# Altium footprint library TomvanRijn-PCB.PcbLib: 165 footprints (part 11 of 11)
Each footprint in its own frame and in the unit in brackets; x right, y up, seen from the top. Pads: shape width x height; smd on the part's side, far side on the other; paste and mask are expansions set on the pad; w line width, h text height; cw(c..) or ccw(c..) is an arc to the next point about the centre after c.
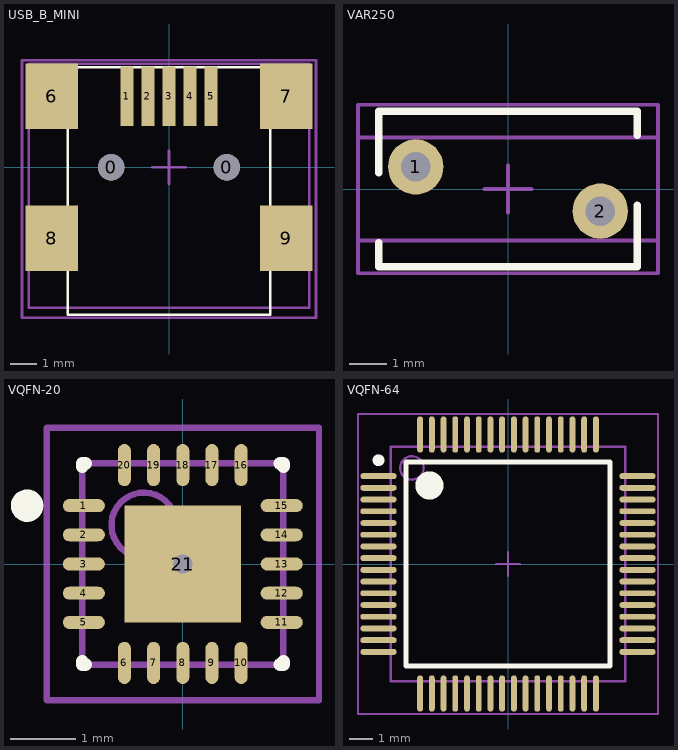
[diagram p10: the footprints below, top view; thin cyan lines are the x and y axes]

## USB-MICRO-TYPE AB [mm] "Micro USB SMD type AB"
3D body "User Library-10104111.step": height 1.39, standoff -1.68, extent -4.4,-1.509 4.4,4.117

## USB_B_MINI [mm] "Connector, USB, B type, Mini"
height 2
pads (11):
  round 1 hole 1: 0(-2.2,0)
  round 1 hole 1 unplated: 0(2.2,0)
  rect 0.5x2.25 smd: 1(-1.6,2.7) 2(-0.8,2.7) 3(0,2.7) 4(0.8,2.7) 5(1.6,2.7)
  rect 2x2.5 smd: 6(-4.45,2.7) 7(4.45,2.7) 8(-4.45,-2.7) 9(4.45,-2.7)
Top Overlay:
  lines w0.1: -3.85,-5.6 3.85,-5.6 3.85,3.8 -3.85,3.8 -3.85,-5.6
Mechanical 13:
  lines w0.1: -5.334,-5.334 -5.334,3.937 5.334,3.937 5.334,-5.334 -5.334,-5.334
Mechanical 15:
  lines w0.1: -0.635,0 0.635,0 ; 0,-0.635 0,0.635 ; -5.588,-5.715 -5.588,4.064 5.588,4.064 5.588,-5.715 -5.588,-5.715
3D body "User Library-USB_mini_B.step": height 3.95, standoff -1, extent -5.35,-5.265 5.35,3.935

## VAR250 [mm] "Varistor, 4 A, 8.5 J, 250 VAC"
height 20
pads (2):
  round 1.5 hole 0.8: 1(-2.5,0.6) 2(2.5,-0.6)
Top Overlay:
  lines w0.203: -3.5,-1.453 -3.5,-2.1 3.5,-2.1 3.5,-0.96 3.5,-0.437 ; -3.5,0.437 -3.5,2.1 3.5,2.1 3.5,1.453
Mechanical 13:
  lines w0.1: -4.064,-1.397 4.064,-1.397 4.064,1.397 -4.064,1.397 -4.064,-1.397
Mechanical 15:
  lines w0.1: -0.635,0 0.635,0 ; 0,-0.635 0,0.635 ; -4.064,-2.286 4.064,-2.286 4.064,2.286 -4.064,2.286 -4.064,-2.286
3D body: height 9.99, standoff 2.01, extent -3.984,-0.762 3.984,0.838
3D body: height 7, standoff -3, extent -2.798,0.301 -2.2,0.899
3D body: height 7, standoff -3, extent 2.202,-0.899 2.8,-0.3

## VQFN-20 [mm] "VQFN, 20-Leads, Body 3,1x3,1mm (max), Pitch 0,45mm, IPC Medium Density"
height 0.8
pads (21):
  oval 0.65x0.2 smd: 1(-1.525,0.9) 2(-1.525,0.45) 3(-1.525,0) 4(-1.525,-0.45) 5(-1.525,-0.9) 11(1.525,-0.9) 12(1.525,-0.45) 13(1.525,0) 14(1.525,0.45) 15(1.525,0.9)
  oval 0.2x0.65 smd: 6(-0.9,-1.525) 7(-0.45,-1.525) 8(0,-1.525) 9(0.45,-1.525) 10(0.9,-1.525) 16(0.9,1.525) 17(0.45,1.525) 18(0,1.525) 19(-0.45,1.525) 20(-0.9,1.525)
  rect 1.8x1.8 smd: 21(0,0)
via 0,0 diameter 0.7 hole 0.3
Top Overlay:
  circle w0.25: c-2.4,0.9 r0.125
  lines w0.2: -1.55,-1.5 -1.55,-1.55 -1.5,-1.55 ; -1.55,1.5 -1.55,1.55 -1.5,1.55 ; 1.5,-1.55 1.55,-1.55 1.55,-1.5 ; 1.5,1.55 1.55,1.55 1.55,1.5
Mechanical 13:
  circle w0.1: c-0.6,0.6 r0.5
  lines w0.1: -1.55,-1.55 -1.55,1.55 1.55,1.55 1.55,-1.55 -1.55,-1.55
Mechanical 15:
  lines w0.1: -0.5,0 0.5,0 ; 0,-0.5 0,0.5 ; -2.1,-2.1 -2.1,2.1 2.1,2.1 2.1,-2.1 -2.1,-2.1
3D body "QFN-20.step": height 0.62, standoff -0.08, extent -1.5,-1.5 1.5,1.5

## VQFN-64 [mm] "Shrink QFP, 64-Leads, Body 10x10mm, Pitch 0.5mm, IPC High Density"
height 1.7
pads (64):
  oval 1.55x0.25 smd: 1(-5.525,3.75) 2(-5.525,3.25) 3(-5.525,2.75) 4(-5.525,2.25) 5(-5.525,1.75) 6(-5.525,1.25) 7(-5.525,0.75) 8(-5.525,0.25) 9(-5.525,-0.25) 10(-5.525,-0.75) 11(-5.525,-1.25) 12(-5.525,-1.75) 13(-5.525,-2.25) 14(-5.525,-2.75) 15(-5.525,-3.25) 16(-5.525,-3.75) 33(5.525,-3.75) 34(5.525,-3.25) 35(5.525,-2.75) 36(5.525,-2.25) 37(5.525,-1.75) 38(5.525,-1.25) 39(5.525,-0.75) 40(5.525,-0.25) 41(5.525,0.25) 42(5.525,0.75) 43(5.525,1.25) 44(5.525,1.75) 45(5.525,2.25) 46(5.525,2.75) 47(5.525,3.25) 48(5.525,3.75)
  oval 0.25x1.55 smd: 17(-3.75,-5.525) 18(-3.25,-5.525) 19(-2.75,-5.525) 20(-2.25,-5.525) 21(-1.75,-5.525) 22(-1.25,-5.525) 23(-0.75,-5.525) 24(-0.25,-5.525) 25(0.25,-5.525) 26(0.75,-5.525) 27(1.25,-5.525) 28(1.75,-5.525) 29(2.25,-5.525) 30(2.75,-5.525) 31(3.25,-5.525) 32(3.75,-5.525) 49(3.75,5.525) 50(3.25,5.525) 51(2.75,5.525) 52(2.25,5.525) 53(1.75,5.525) 54(1.25,5.525) 55(0.75,5.525) 56(0.25,5.525) 57(-0.25,5.525) 58(-0.75,5.525) 59(-1.25,5.525) 60(-1.75,5.525) 61(-2.25,5.525) 62(-2.75,5.525) 63(-3.25,5.525) 64(-3.75,5.525)
Top Overlay:
  circle w0.6: c-3.35,3.35 r0.3
  circle w0.25: c-5.525,4.425 r0.125
  lines w0.2: -4.35,-4.35 4.35,-4.35 4.35,4.35 -4.35,4.35 -4.35,-4.35
Mechanical 13:
  circle w0.1: c-4.1,4.1 r0.5
  lines w0.1: -5,-5 5,-5 5,5 -5,5 -5,-5
Mechanical 15:
  lines w0.1: -0.5,0 0.5,0 ; 0,-0.5 0,0.5 ; -6.4,-6.4 6.4,-6.4 6.4,6.4 -6.4,6.4 -6.4,-6.4
3D body "QFP65.step": height 1, standoff 0, extent -5.791,-5.787 5.79,5.787